# Altium footprint library ref-packages-longpad.PCBLIB: 1527 footprints (part 29 of 103)
Each footprint in its own frame and in the unit in brackets; x right, y up, seen from the top. Pads: shape width x height; smd on the part's side, far side on the other; paste and mask are expansions set on the pad; w line width, h text height; cw(c..) or ccw(c..) is an arc to the next point about the centre after c.
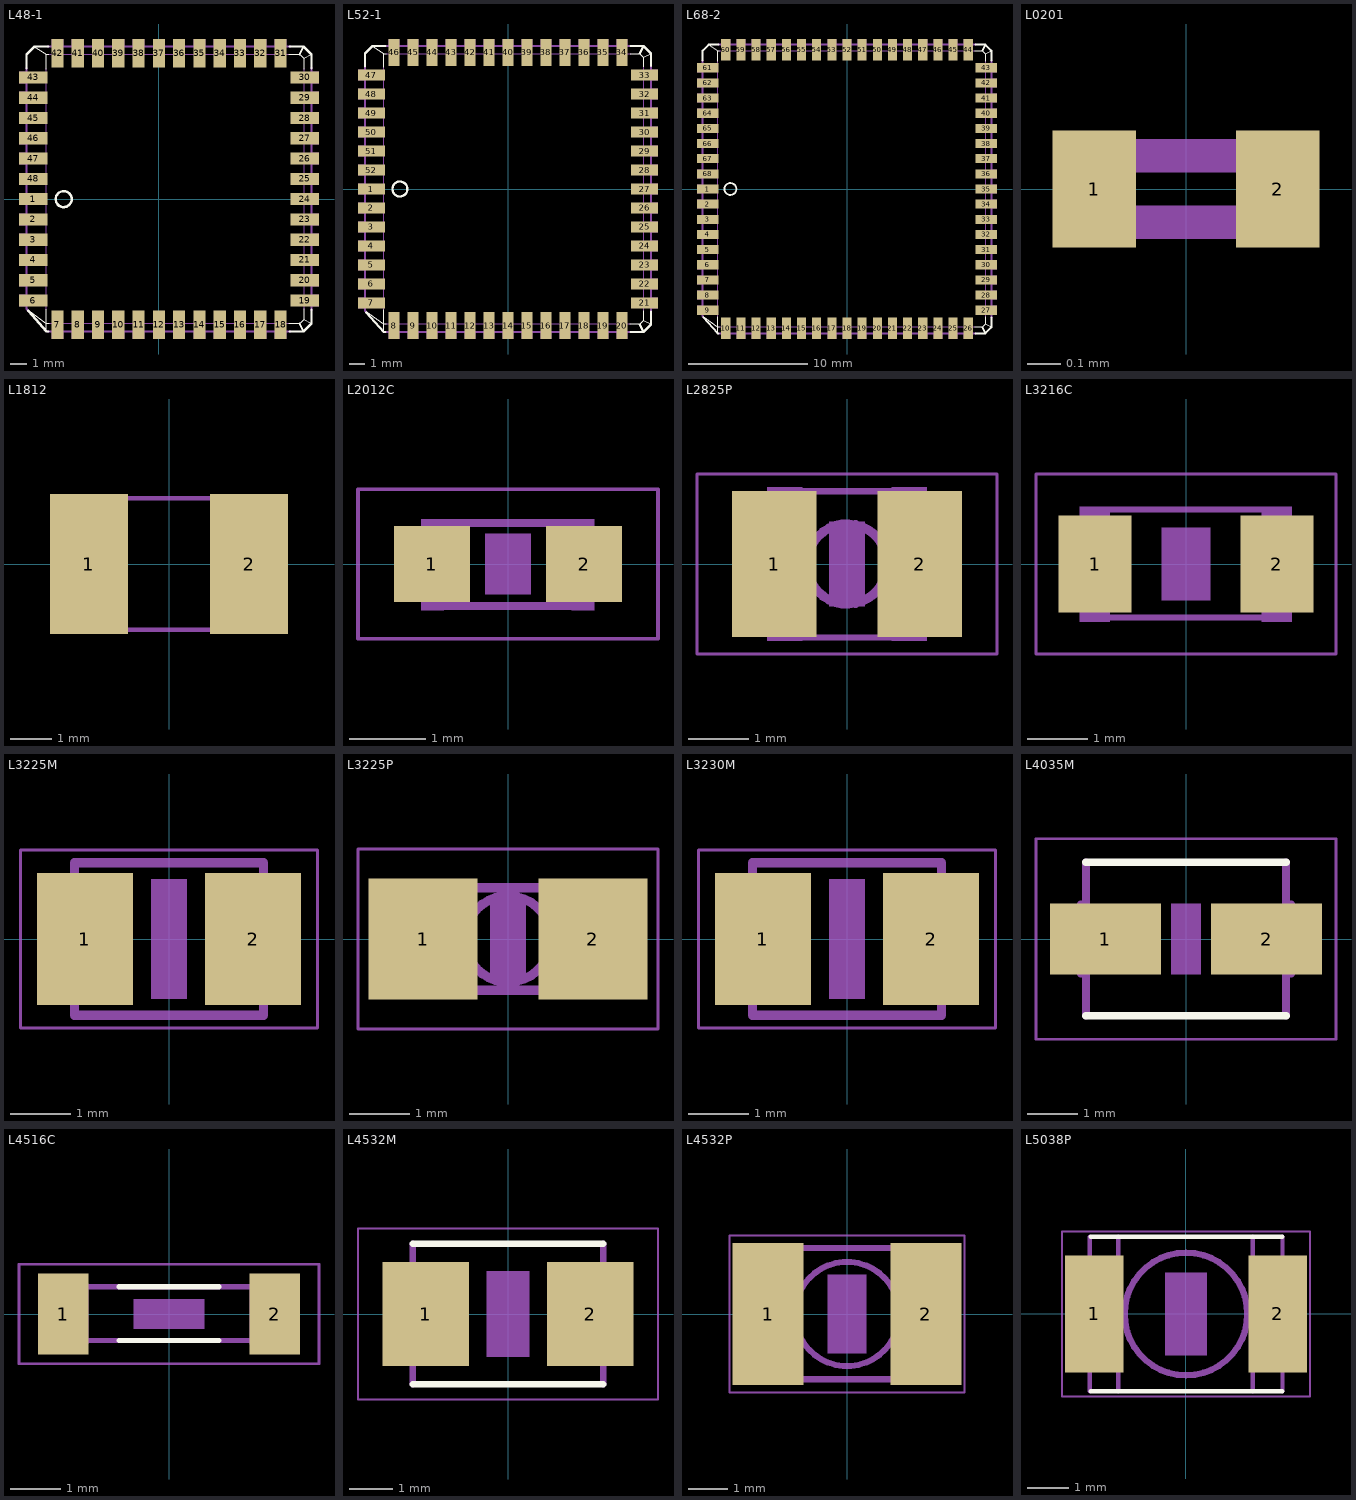
[diagram p28: the footprints below, top view; thin cyan lines are the x and y axes]

## L48-1 [mil]
pads (48):
  rect 70.87x29.92 smd: 1(-309.45,0) 2(-309.45,-50) 3(-309.45,-100) 4(-309.45,-150) 5(-309.45,-200) 6(-309.45,-250) 19(359.45,-250) 20(359.45,-200) 21(359.45,-150) 22(359.45,-100) 23(359.45,-50) 24(359.45,0) 25(359.45,50) 26(359.45,100) 27(359.45,150) 28(359.45,200) 29(359.45,250) 30(359.45,300) 43(-309.45,300) 44(-309.45,250) 45(-309.45,200) 46(-309.45,150) 47(-309.45,100) 48(-309.45,50)
  rect 29.92x70.87 smd: 7(-250,-309.45) 8(-200,-309.45) 9(-150,-309.45) 10(-100,-309.45) 11(-50,-309.45) 12(0,-309.45) 13(50,-309.45) 14(100,-309.45) 15(150,-309.45) 16(200,-309.45) 17(250,-309.45) 18(300,-309.45) 31(300,359.45) 32(250,359.45) 33(200,359.45) 34(150,359.45) 35(100,359.45) 36(50,359.45) 37(0,359.45) 38(-50,359.45) 39(-100,359.45) 40(-150,359.45) 41(-200,359.45) 42(-250,359.45)
Top Overlay:
  circle w6: c-234.65,0 r19.69
  lines w2: -322.01,-273.9 -277.17,-306.69 ; -306.69,376.38 -277.17,356.69 ; -277.17,-326.38 -277.17,-306.69 ; -277.17,-271.69 -277.17,-306.69 ; -277.17,320.71 -277.17,356.69 ; -271.69,356.69 -277.17,356.69 ; -270.71,-306.69 -277.17,-306.69 ; 320.71,-306.69 346.85,-306.69 356.69,-296.85 ; 320.71,356.69 346.85,356.69 356.69,346.85 ; 356.69,-270.71 356.69,-296.85 ; 356.69,320.71 356.69,346.85 ; 376.38,-306.69 356.69,-296.85 ; 376.38,356.69 356.69,346.85
  lines w6: -326.38,323.27 -326.38,356.69 -306.69,376.38 -273.27,376.38 ; -321.85,-275.59 -277.17,-326.38 -273.27,-326.38 ; 323.27,-326.38 356.69,-326.38 ; 323.27,376.38 356.69,376.38 ; 346.85,-306.69 356.69,-326.38 ; 346.85,356.69 356.69,376.38 ; 376.38,-273.27 376.38,-306.69 356.69,-326.38 ; 376.38,323.27 376.38,356.69 356.69,376.38
Mechanical 16:
  rectangle: -114.96,376.38 -85.04,394.88
  rectangle: -64.96,376.38 -35.04,394.88
  rectangle: -14.96,376.38 14.96,394.88
  rectangle: 35.04,376.38 64.96,394.88
  rectangle: 85.04,376.38 114.96,394.88
  rectangle: 135.04,376.38 164.96,394.88
  rectangle: 185.04,376.38 214.96,394.88
  rectangle: 376.38,135.04 394.88,164.96
  rectangle: 376.38,85.04 394.88,114.96
  rectangle: 376.38,35.04 394.88,64.96
  rectangle: 376.38,-14.96 394.88,14.96
  rectangle: 376.38,-64.96 394.88,-35.04
  rectangle: 376.38,-114.96 394.88,-85.04
  rectangle: 376.38,-264.96 394.88,-235.04
  rectangle: -214.96,-344.88 -185.04,-326.38
  rectangle: -164.96,-344.88 -135.04,-326.38
  rectangle: -114.96,-344.88 -85.04,-326.38
  rectangle: -64.96,-344.88 -35.04,-326.38
  rectangle: -14.96,-344.88 14.96,-326.38
  rectangle: 35.04,-344.88 64.96,-326.38
  rectangle: 85.04,-344.88 114.96,-326.38
  rectangle: -344.88,135.04 -326.38,164.96
  rectangle: -344.88,85.04 -326.38,114.96
  rectangle: -344.88,35.04 -326.38,64.96
  rectangle: -344.88,-14.96 -326.38,14.96
  rectangle: -344.88,-64.96 -326.38,-35.04
  rectangle: -344.88,-114.96 -326.38,-85.04
  rectangle: -344.88,-264.96 -326.38,-235.04
  rectangle: -164.96,376.38 -135.04,394.88
  rectangle: -214.96,376.38 -185.04,394.88
  rectangle: 135.04,-344.88 164.96,-326.38
  rectangle: 185.04,-344.88 214.96,-326.38
  rectangle: -344.88,185.04 -326.38,214.96
  rectangle: -344.88,235.04 -326.38,264.96
  rectangle: -344.88,-164.96 -326.38,-135.04
  rectangle: -344.88,-214.96 -326.38,-185.04
  rectangle: 235.04,-344.88 264.96,-326.38
  rectangle: 376.38,-214.96 394.88,-185.04
  rectangle: 376.38,-164.96 394.88,-135.04
  rectangle: 376.38,185.04 394.88,214.96
  rectangle: 376.38,235.04 394.88,264.96
  rectangle: 235.04,376.38 264.96,394.88
  rectangle: -264.96,376.38 -235.04,394.88
  rectangle: -264.96,-344.88 -235.04,-326.38
  rectangle: 376.38,285.04 394.88,314.96
  rectangle: 285.04,376.38 314.96,394.88
  rectangle: -344.88,285.04 -326.38,314.96
  rectangle: 285.04,-344.88 314.96,-326.38
  lines w2: -277.17,-271.57 -277.17,321.14 ; -273.07,356.69 321.85,356.69 ; -271.89,-306.69 321.85,-306.69 ; 356.69,-271.85 356.69,321.85
  lines w6: -326.38,-270.12 -321.85,-275.59 ; -326.38,-269.96 -326.38,322.68 ; -274.13,-326.38 323.66,-326.38 ; -273.66,376.38 323.66,376.38 ; 376.38,-273.66 376.38,323.74

## L52-1 [mil]
pads (52):
  rect 70.87x29.92 smd: 1(-359.45,0) 2(-359.45,-50) 3(-359.45,-100) 4(-359.45,-150) 5(-359.45,-200) 6(-359.45,-250) 7(-359.45,-300) 21(359.45,-300) 22(359.45,-250) 23(359.45,-200) 24(359.45,-150) 25(359.45,-100) 26(359.45,-50) 27(359.45,0) 28(359.45,50) 29(359.45,100) 30(359.45,150) 31(359.45,200) 32(359.45,250) 33(359.45,300) 47(-359.45,300) 48(-359.45,250) 49(-359.45,200) 50(-359.45,150) 51(-359.45,100) 52(-359.45,50)
  rect 29.92x70.87 smd: 8(-300,-359.45) 9(-250,-359.45) 10(-200,-359.45) 11(-150,-359.45) 12(-100,-359.45) 13(-50,-359.45) 14(0,-359.45) 15(50,-359.45) 16(100,-359.45) 17(150,-359.45) 18(200,-359.45) 19(250,-359.45) 20(300,-359.45) 34(300,359.45) 35(250,359.45) 36(200,359.45) 37(150,359.45) 38(100,359.45) 39(50,359.45) 40(0,359.45) 41(-50,359.45) 42(-100,359.45) 43(-150,359.45) 44(-200,359.45) 45(-250,359.45) 46(-300,359.45)
Top Overlay:
  circle w6: c-284.65,0 r19.69
  lines w2: -372.83,-323.5 -327.17,-356.69 ; -356.69,376.38 -327.17,356.69 ; -327.17,-376.38 -327.17,-356.69 ; -327.17,-317.76 -327.17,-356.69 ; -327.17,320.71 -327.17,356.69 ; -320.71,-356.69 -327.17,-356.69 ; -320.71,356.69 -327.17,356.69 ; 320.71,-356.69 346.85,-356.69 356.69,-346.85 ; 321.69,356.69 346.85,356.69 356.69,346.85 ; 356.69,-320.71 356.69,-346.85 ; 356.69,321.69 356.69,346.85 ; 376.38,-356.69 356.69,-346.85 ; 376.38,356.69 356.69,346.85
  lines w6: -376.38,323.27 -376.38,356.69 -356.69,376.38 -323.27,376.38 ; -373.03,-325 -327.17,-376.38 -323.27,-376.38 ; 323.27,-376.38 356.69,-376.38 ; 323.27,376.38 356.69,376.38 ; 346.85,-356.69 356.69,-376.38 ; 346.85,356.69 356.69,376.38 ; 376.38,-323.27 376.38,-356.69 356.69,-376.38 ; 376.38,324.25 376.38,356.69 356.69,376.38
Mechanical 16:
  rectangle: -164.96,376.38 -135.04,394.88
  rectangle: -114.96,376.38 -85.04,394.88
  rectangle: -64.96,376.38 -35.04,394.88
  rectangle: -14.96,376.38 14.96,394.88
  rectangle: 35.04,376.38 64.96,394.88
  rectangle: 85.04,376.38 114.96,394.88
  rectangle: 135.04,376.38 164.96,394.88
  rectangle: 376.38,85.04 394.88,114.96
  rectangle: 376.38,35.04 394.88,64.96
  rectangle: 376.38,-14.96 394.88,14.96
  rectangle: 376.38,-64.96 394.88,-35.04
  rectangle: 376.38,-114.96 394.88,-85.04
  rectangle: 376.38,-164.96 394.88,-135.04
  rectangle: 376.38,-314.96 394.88,-285.04
  rectangle: -264.96,-394.88 -235.04,-376.38
  rectangle: -214.96,-394.88 -185.04,-376.38
  rectangle: -164.96,-394.88 -135.04,-376.38
  rectangle: -114.96,-394.88 -85.04,-376.38
  rectangle: -64.96,-394.88 -35.04,-376.38
  rectangle: -14.96,-394.88 14.96,-376.38
  rectangle: 35.04,-394.88 64.96,-376.38
  rectangle: -394.88,85.04 -376.38,114.96
  rectangle: -394.88,35.04 -376.38,64.96
  rectangle: -394.88,-14.96 -376.38,14.96
  rectangle: -394.88,-64.96 -376.38,-35.04
  rectangle: -394.88,-114.96 -376.38,-85.04
  rectangle: -394.88,-164.96 -376.38,-135.04
  rectangle: -394.88,-314.96 -376.38,-285.04
  rectangle: -214.96,376.38 -185.04,394.88
  rectangle: -264.96,376.38 -235.04,394.88
  rectangle: 85.04,-394.88 114.96,-376.38
  rectangle: 135.04,-394.88 164.96,-376.38
  rectangle: -394.88,135.04 -376.38,164.96
  rectangle: -394.88,185.04 -376.38,214.96
  rectangle: -394.88,-214.96 -376.38,-185.04
  rectangle: -394.88,-264.96 -376.38,-235.04
  rectangle: 185.04,-394.88 214.96,-376.38
  rectangle: 376.38,-264.96 394.88,-235.04
  rectangle: 376.38,-214.96 394.88,-185.04
  rectangle: 376.38,135.04 394.88,164.96
  rectangle: 376.38,185.04 394.88,214.96
  rectangle: 185.04,376.38 214.96,394.88
  rectangle: -314.96,376.38 -285.04,394.88
  rectangle: -314.96,-394.88 -285.04,-376.38
  rectangle: 235.04,376.38 264.96,394.88
  rectangle: 235.04,-394.88 264.96,-376.38
  rectangle: 285.04,-394.88 314.96,-376.38
  rectangle: 285.04,376.38 314.96,394.88
  rectangle: -394.88,235.04 -376.38,264.96
  rectangle: -394.88,285.04 -376.38,314.96
  rectangle: 376.38,235.04 394.88,264.96
  rectangle: 376.38,285.04 394.88,314.96
  lines w2: -327.17,-320.67 -327.17,322.24 ; -322.28,-356.69 321.85,-356.69 ; -321.02,356.69 322.91,356.69 ; 356.69,-321.85 356.69,321.93
  lines w6: -376.38,-320.12 -373.03,-325 ; -376.38,-319.96 -376.38,323.66 ; -323.15,-376.38 323.66,-376.38 ; -322.68,376.38 323.74,376.38 ; 376.38,-323.66 376.38,324.72

## L68-2 [mil]
pads (68):
  rect 70.87x29.92 smd: 1(-459.45,0) 2(-459.45,-50) 3(-459.45,-100) 4(-459.45,-150) 5(-459.45,-200) 6(-459.45,-250) 7(-459.45,-300) 8(-459.45,-350) 9(-459.45,-400) 27(459.45,-400) 28(459.45,-350) 29(459.45,-300) 30(459.45,-250) 31(459.45,-200) 32(459.45,-150) 33(459.45,-100) 34(459.45,-50) 35(459.45,0) 36(459.45,50) 37(459.45,100) 38(459.45,150) 39(459.45,200) 40(459.45,250) 41(459.45,300) 42(459.45,350) 43(459.45,400) 61(-459.45,400) 62(-459.45,350) 63(-459.45,300) 64(-459.45,250) 65(-459.45,200) 66(-459.45,150) 67(-459.45,100) 68(-459.45,50)
  rect 29.92x70.87 smd: 10(-400,-459.45) 11(-350,-459.45) 12(-300,-459.45) 13(-250,-459.45) 14(-200,-459.45) 15(-150,-459.45) 16(-100,-459.45) 17(-50,-459.45) 18(0,-459.45) 19(50,-459.45) 20(100,-459.45) 21(150,-459.45) 22(200,-459.45) 23(250,-459.45) 24(300,-459.45) 25(350,-459.45) 26(400,-459.45) 44(400,459.45) 45(350,459.45) 46(300,459.45) 47(250,459.45) 48(200,459.45) 49(150,459.45) 50(100,459.45) 51(50,459.45) 52(0,459.45) 53(-50,459.45) 54(-100,459.45) 55(-150,459.45) 56(-200,459.45) 57(-250,459.45) 58(-300,459.45) 59(-350,459.45) 60(-400,459.45)
Top Overlay:
  circle w6: c-384.65,0 r19.69
  lines w2: -473.82,-421.54 -427.17,-456.69 ; -456.69,476.38 -427.17,456.69 ; -427.17,-476.38 -427.17,-456.69 ; -427.17,-420.71 -427.17,-456.69 ; -427.17,420.71 -427.17,456.69 ; -420.71,-456.69 -427.17,-456.69 ; -420.71,456.69 -427.17,456.69 ; 420.71,-456.69 446.85,-456.69 456.69,-446.85 ; 421.69,456.69 446.85,456.69 456.69,446.85 ; 456.69,-420.71 456.69,-446.85 ; 456.69,420.71 456.69,446.85 ; 476.38,-456.69 456.69,-446.85 ; 476.38,456.69 456.69,446.85
  lines w6: -476.38,423.27 -476.38,456.69 -456.69,476.38 -423.27,476.38 ; -474.02,-423.03 -427.17,-476.38 -423.27,-476.38 ; 423.27,-476.38 456.69,-476.38 ; 423.27,476.38 456.69,476.38 ; 446.85,-456.69 456.69,-476.38 ; 446.85,456.69 456.69,476.38 ; 476.38,-423.27 476.38,-456.69 456.69,-476.38 ; 476.38,423.27 476.38,456.69 456.69,476.38
Mechanical 16:
  rectangle: -114.96,476.38 -85.04,494.88
  rectangle: -64.96,476.38 -35.04,494.88
  rectangle: -14.96,476.38 14.96,494.88
  rectangle: 35.04,476.38 64.96,494.88
  rectangle: 85.04,476.38 114.96,494.88
  rectangle: 135.04,476.38 164.96,494.88
  rectangle: 185.04,476.38 214.96,494.88
  rectangle: 476.38,135.04 494.88,164.96
  rectangle: 476.38,85.04 494.88,114.96
  rectangle: 476.38,35.04 494.88,64.96
  rectangle: 476.38,-14.96 494.88,14.96
  rectangle: 476.38,-64.96 494.88,-35.04
  rectangle: 476.38,-114.96 494.88,-85.04
  rectangle: 476.38,-414.96 494.88,-385.04
  rectangle: -214.96,-494.88 -185.04,-476.38
  rectangle: -164.96,-494.88 -135.04,-476.38
  rectangle: -114.96,-494.88 -85.04,-476.38
  rectangle: -64.96,-494.88 -35.04,-476.38
  rectangle: -14.96,-494.88 14.96,-476.38
  rectangle: 35.04,-494.88 64.96,-476.38
  rectangle: 85.04,-494.88 114.96,-476.38
  rectangle: -494.88,135.04 -476.38,164.96
  rectangle: -494.88,85.04 -476.38,114.96
  rectangle: -494.88,35.04 -476.38,64.96
  rectangle: -494.88,-14.96 -476.38,14.96
  rectangle: -494.88,-64.96 -476.38,-35.04
  rectangle: -494.88,-114.96 -476.38,-85.04
  rectangle: -494.88,-414.96 -476.38,-385.04
  rectangle: -164.96,476.38 -135.04,494.88
  rectangle: -214.96,476.38 -185.04,494.88
  rectangle: 135.04,-494.88 164.96,-476.38
  rectangle: 185.04,-494.88 214.96,-476.38
  rectangle: -494.88,185.04 -476.38,214.96
  rectangle: -494.88,235.04 -476.38,264.96
  rectangle: -494.88,-164.96 -476.38,-135.04
  rectangle: -494.88,-214.96 -476.38,-185.04
  rectangle: 235.04,-494.88 264.96,-476.38
  rectangle: 476.38,-214.96 494.88,-185.04
  rectangle: 476.38,-164.96 494.88,-135.04
  rectangle: 476.38,185.04 494.88,214.96
  rectangle: 476.38,235.04 494.88,264.96
  rectangle: 235.04,476.38 264.96,494.88
  rectangle: -264.96,476.38 -235.04,494.88
  rectangle: -264.96,-494.88 -235.04,-476.38
  rectangle: 476.38,-264.96 494.88,-235.04
  rectangle: 476.38,-314.96 494.88,-285.04
  rectangle: 476.38,-364.96 494.88,-335.04
  rectangle: 285.04,-494.88 314.96,-476.38
  rectangle: 335.04,-494.88 364.96,-476.38
  rectangle: 385.04,-494.88 414.96,-476.38
  rectangle: -314.96,-494.88 -285.04,-476.38
  rectangle: -364.96,-494.88 -335.04,-476.38
  rectangle: -414.96,-494.88 -385.04,-476.38
  rectangle: -494.88,-264.96 -476.38,-235.04
  rectangle: -494.88,-314.96 -476.38,-285.04
  rectangle: -494.88,-364.96 -476.38,-335.04
  rectangle: -314.96,476.38 -285.04,494.88
  rectangle: -364.96,476.38 -335.04,494.88
  rectangle: -414.96,476.38 -385.04,494.88
  rectangle: -494.88,285.04 -476.38,314.96
  rectangle: -494.88,335.04 -476.38,364.96
  rectangle: -494.88,385.04 -476.38,414.96
  rectangle: 285.04,476.38 314.96,494.88
  rectangle: 335.04,476.38 364.96,494.88
  rectangle: 385.04,476.38 414.96,494.88
  rectangle: 476.38,285.04 494.88,314.96
  rectangle: 476.38,335.04 494.88,364.96
  rectangle: 476.38,385.04 494.88,414.96
  lines w2: -427.17,-421.85 -427.17,421.06 ; -421.42,-456.69 421.85,-456.69 ; -421.42,456.69 421.85,456.69 ; 456.69,-421.85 456.69,421.85
  lines w6: -476.38,-420.12 -474.02,-423.03 ; -476.38,-419.96 -476.38,423.66 ; -423.66,476.38 423.74,476.38 ; -423.07,-476.38 423.66,-476.38 ; 476.38,-423.66 476.38,423.66

## L0201 [mm]
pads (2):
  rect 0.25x0.35 smd: 1(-0.275,0) 2(0.275,0)
Mechanical 16:
  rectangle: -0.3,-0.15 -0.15,0.15
  rectangle: 0.15,-0.15 0.3,0.15
  rectangle: -0.15,0.05 0.15,0.15
  rectangle: -0.15,-0.15 0.15,-0.05

## L1812 [mil]
pads (2):
  rect 74.8x133.86 smd: 1(-76.77,0) 2(76.77,0)
Mechanical 16:
  rectangle: -94,-65 -56.6,64.92
  rectangle: 57,-65 94.4,64.92
  lines w4: -58,63 58,63 ; -57,-63 58,-63

## L2012C [mm]
pads (2):
  rect 1x1 smd: 1(-1,0) 2(1,0)
Mechanical 6:
  rectangle: -0.3,-0.4 0.3,0.4
Mechanical 16:
  rectangle: -1.143,-0.61 -0.843,0.59
  rectangle: 0.838,-0.61 1.138,0.59
  lines w0.102: -0.864,-0.553 0.864,-0.553 ; -0.864,0.54 0.864,0.54
Mechanical 27:
  lines w0.051: -1.973,-0.983 1.973,-0.983 1.973,0.983 -1.973,0.983 -1.973,-0.983

## L2825P [mil]
pads (2):
  rect 55.12x94.49 smd: 1(-47.24,0) 2(47.24,0)
Mechanical 6:
  rectangle: -11.81,-27.56 11.81,27.56
Mechanical 16:
  circle w6: c0,0 r26
  rectangle: 29,-50 52,50
  rectangle: -52,-50 -29,50
  lines w4: -52.76,-37.99 -52.76,37.99 ; -30,-47.76 30,-47.76 ; -30,47.24 30,47.24 ; 52.76,-37.99 52.76,37.99
Mechanical 27:
  lines w2: -97.36,-58.39 97.36,-58.39 97.36,58.39 -97.36,58.39 -97.36,-58.39

## L3216C [mil]
pads (2):
  rect 47.24x62.99 smd: 1(-59.06,0) 2(59.06,0)
Mechanical 6:
  rectangle: -15.75,-23.62 15.75,23.62
Mechanical 16:
  rectangle: -69,-37.5 -49.31,37.3
  rectangle: 49,-37.5 68.69,37.3
  lines w4: -50,-34.76 50,-34.76 ; -50,35.28 50,35.28
Mechanical 27:
  lines w2: -97.36,-58.39 97.36,-58.39 97.36,58.39 -97.36,58.39 -97.36,-58.39

## L3225M [mil]
pads (2):
  rect 62.99x86.61 smd: 1(-55.12,0) 2(55.12,0)
Mechanical 6:
  rectangle: -11.81,-39.37 11.81,39.37
Mechanical 16:
  lines w6: -65,-37.01 -65,37.01 ; 65,-37.01 65,37.01 ; -62.01,-50 62.01,-50 62.01,50 -62.01,50 -62.01,-50
Mechanical 27:
  lines w2: -97.36,-58.39 97.36,-58.39 97.36,58.39 -97.36,58.39 -97.36,-58.39

## L3225P [mm]
pads (2):
  rect 1.8x2 smd: 1(-1.4,0) 2(1.4,0)
Mechanical 6:
  rectangle: -0.3,-0.7 0.3,0.7
Mechanical 16:
  circle w0.152: c0,0 r0.712
  lines w0.152: -1.676,-0.845 1.676,-0.845 ; -1.676,-0.838 -1.676,0.838 ; -1.676,0.845 1.676,0.845 ; -1.168,-0.838 -1.168,0.838 ; 1.168,-0.838 1.168,0.838 ; 1.676,-0.838 1.676,0.838
Mechanical 27:
  lines w0.051: -2.473,-1.483 2.473,-1.483 2.473,1.483 -2.473,1.483 -2.473,-1.483

## L3230M [mil]
pads (2):
  rect 62.99x86.61 smd: 1(-55.12,0) 2(55.12,0)
Mechanical 6:
  rectangle: -11.81,-39.37 11.81,39.37
Mechanical 16:
  lines w6: -65,-37.01 -65,37.01 ; 65,-37.01 65,37.01 ; -62.01,-50 62.01,-50 62.01,50 -62.01,50 -62.01,-50
Mechanical 27:
  lines w2: -97.36,-58.39 97.36,-58.39 97.36,58.39 -97.36,58.39 -97.36,-58.39

## L4035M [mil]
pads (2):
  rect 86.61x55.12 smd: 1(-62.99,0) 2(62.99,0)
Top Overlay:
  lines w6: -77.99,-60 77.99,-60 ; -77.99,60 77.99,60
Mechanical 6:
  rectangle: -11.81,-27.56 11.81,27.56
Mechanical 16:
  lines w6: -82.01,-27.01 -82.01,27.01 ; -77.99,-60 -77.99,60 ; 77.99,-60 77.99,60 ; 82.01,-27.01 82.01,27.01
Mechanical 27:
  lines w2: -117.05,-78.07 117.05,-78.07 117.05,78.07 -117.05,78.07 -117.05,-78.07

## L4516C [mm]
pads (2):
  rect 1x1.6 smd: 1(-2.1,0) 2(2.1,0)
Top Overlay:
  lines w0.102: -0.991,-0.527 0.991,-0.527 ; -0.991,0.54 0.991,0.54
Mechanical 6:
  rectangle: -0.7,-0.3 0.7,0.3
Mechanical 16:
  rectangle: -2.4,-0.597 -1.6,0.603
  rectangle: 1.6,-0.603 2.4,0.597
  lines w0.102: -1.626,-0.527 1.626,-0.527 ; -1.626,0.54 1.626,0.54
Mechanical 27:
  lines w0.051: -2.973,-0.983 2.973,-0.983 2.973,0.983 -2.973,0.983 -2.973,-0.983

## L4532M [mm]
pads (2):
  rect 2x2.4 smd: 1(-1.9,0) 2(1.9,0)
Top Overlay:
  lines w0.152: -2.21,-1.626 2.21,-1.626 ; -2.21,1.626 2.21,1.626
Mechanical 6:
  rectangle: -0.5,-1 0.5,1
Mechanical 16:
  lines w0.152: -2.337,-1.041 -2.337,1.041 ; -2.21,-1.626 -2.21,1.626 ; 2.21,-1.626 2.21,1.626 ; 2.337,-1.041 2.337,1.041
Mechanical 27:
  lines w0.051: -3.473,-1.983 3.473,-1.983 3.473,1.983 -3.473,1.983 -3.473,-1.983

## L4532P [mm]
pads (2):
  rect 1.8x3.6 smd: 1(-2,0) 2(2,0)
Mechanical 6:
  rectangle: -0.5,-1 0.5,1
Mechanical 16:
  circle w0.152: c0,0 r1.321
  lines w0.152: -2.311,-1.653 2.311,-1.653 ; -2.311,-1.626 -2.311,1.626 ; -2.311,1.675 2.311,1.675 2.311,-1.626 ; -1.448,-1.626 -1.448,1.651 ; 1.448,-1.626 1.448,1.626
Mechanical 27:
  lines w0.051: -2.973,-1.983 2.973,-1.983 2.973,1.983 -2.973,1.983 -2.973,-1.983

## L5038P [mil]
pads (2):
  rect 55.12x110.24 smd: 1(-86.61,0) 2(86.61,0)
Top Overlay:
  lines w4: -90,-73.07 90.98,-73.07 ; -90,72.95 90.98,72.95
Mechanical 6:
  rectangle: -19.69,-39.37 19.69,39.37
Mechanical 16:
  circle w6: c0,0 r58
  lines w4: -93.94,-50 -93.94,50 ; -90.94,-72.99 -90.94,72.99 ; -63.94,-72.99 -63.94,72.99 ; 63.07,-72.99 63.07,72.99 ; 91.06,-72.99 91.06,72.99 ; 94.06,-50 94.06,50
Mechanical 27:
  lines w2: -117.05,-78.07 117.05,-78.07 117.05,78.07 -117.05,78.07 -117.05,-78.07